# Altium footprint library BIOSCOPE-LIB.PcbLib: 33 footprints (part 2 of 3)
Each footprint in its own frame and in the unit in brackets; x right, y up, seen from the top. Pads: shape width x height; smd on the part's side, far side on the other; paste and mask are expansions set on the pad; w line width, h text height; cw(c..) or ccw(c..) is an arc to the next point about the centre after c.
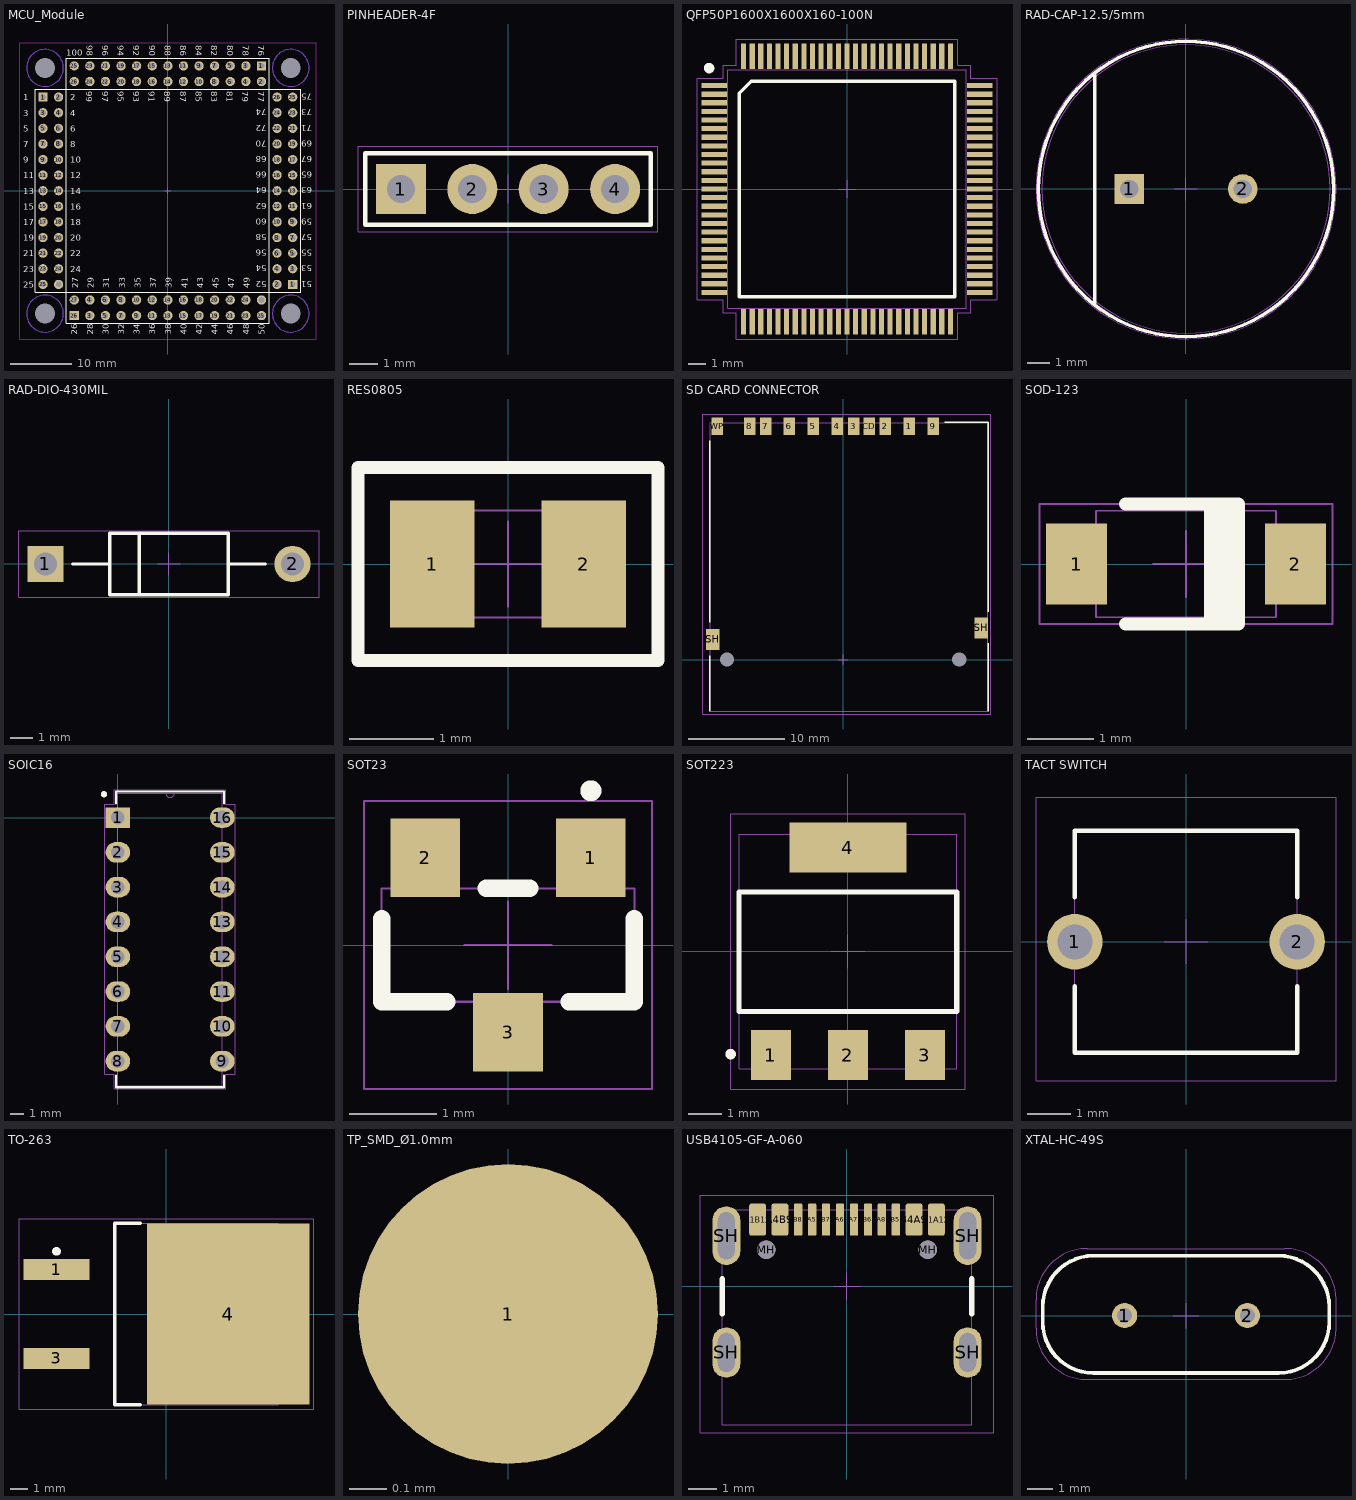
[diagram p1: the footprints below, top view; thin cyan lines are the x and y axes]

## MCU_Module [mm]
pads (108):
  round 0 hole 3.25: 0(-20,-20) 0(-20,20) 0(20,-20) 0(20,20)
  rect 1.5x1.5 hole 0.9: 1(-20.32,15.24) 1(15.24,20.32) 1(20.32,-15.24) 26(-15.24,-20.32)
  round 1.5 hole 0.9: 2(-17.78,15.24) 2(15.24,17.78) 2(17.78,-15.24) 3(-20.32,12.7) 3(-12.7,-20.32) 3(12.7,20.32) 3(20.32,-12.7) 4(-17.78,12.7) 4(-12.7,-17.78) 4(12.7,17.78) 4(17.78,-12.7) 5(-20.32,10.16) 5(-10.16,-20.32) 5(10.16,20.32) 5(20.32,-10.16) 6(-17.78,10.16) 6(-10.16,-17.78) 6(10.16,17.78) 6(17.78,-10.16) 7(-20.32,7.62) 7(-7.62,-20.32) 7(7.62,20.32) 7(20.32,-7.62) 8(-17.78,7.62) 8(-7.62,-17.78) 8(7.62,17.78) 8(17.78,-7.62) 9(-20.32,5.08) 9(-5.08,-20.32) 9(5.08,20.32) 9(20.32,-5.08) 10(-17.78,5.08) 10(-5.08,-17.78) 10(5.08,17.78) 10(17.78,-5.08) 11(-20.32,2.54) 11(-2.54,-20.32) 11(2.54,20.32) 11(20.32,-2.54) 12(-17.78,2.54) 12(-2.54,-17.78) 12(2.54,17.78) 12(17.78,-2.54) 13(-20.32,0) 13(0,-20.32) 13(0,20.32) 13(20.32,0) 14(-17.78,0) 14(0,-17.78) 14(0,17.78) 14(17.78,0) 15(-20.32,-2.54) 15(-2.54,20.32) 15(2.54,-20.32) 15(20.32,2.54) 16(-17.78,-2.54) 16(-2.54,17.78) 16(2.54,-17.78) 16(17.78,2.54) 17(-20.32,-5.08) 17(-5.08,20.32) 17(5.08,-20.32) 17(20.32,5.08) 18(-17.78,-5.08) 18(-5.08,17.78) 18(5.08,-17.78) 18(17.78,5.08) 19(-20.32,-7.62) 19(-7.62,20.32) 19(7.62,-20.32) 19(20.32,7.62) 20(-17.78,-7.62) 20(-7.62,17.78) 20(7.62,-17.78) 20(17.78,7.62) 21(-20.32,-10.16) 21(-10.16,20.32) 21(10.16,-20.32) 21(20.32,10.16) 22(-17.78,-10.16) 22(-10.16,17.78) 22(10.16,-17.78) 22(17.78,10.16) 23(-20.32,-12.7) 23(-12.7,20.32) 23(12.7,-20.32) 23(20.32,12.7) 24(-17.78,-12.7) 24(-12.7,17.78) 24(12.7,-17.78) 24(17.78,12.7) 25(-20.32,-15.24) 25(-15.24,20.32) 25(15.24,-20.32) 25(20.32,15.24) 26(-15.24,17.78) 26(17.78,15.24) 27(-15.24,-17.78) ""(-17.78,-15.24) ""(15.24,-17.78)
Bottom Layer keep-out:
  circle w0.15: c20,-20 r3
  circle w0.15: c20,20 r3
  circle w0.15: c-20,20 r3
  circle w0.15: c-20,-20 r3
Top Overlay:
  lines w0.2: -16.51,-16.51 -21.59,-16.51 -21.59,16.51 -16.51,16.51 ; -16.51,-16.51 -16.51,16.51 ; -16.51,-16.51 -16.51,-21.59 16.51,-21.59 16.51,-16.51 ; -16.51,-16.51 16.51,-16.51 ; -16.51,16.51 -16.51,21.59 16.51,21.59 16.51,16.51 ; -16.51,16.51 16.51,16.51 ; 16.51,-16.51 21.59,-16.51 21.59,16.51 16.51,16.51 ; 16.51,-16.51 16.51,16.51
  text "49" at 13.36,-15.9 h1
  text "47" at 10.82,-15.9 h1
  text "50" at 15.76,-23.4 h1
  text "48" at 13.22,-23.4 h1
  text "46" at 10.68,-23.4 h1
  text "45" at 8.28,-15.9 h1
  text "44" at 8.14,-23.4 h1
  text "43" at 5.74,-15.9 h1
  text "42" at 5.6,-23.4 h1
  text "41" at 3.2,-15.9 h1
  text "40" at 3.06,-23.4 h1
  text "39" at 0.66,-15.9 h1
  text "38" at 0.52,-23.4 h1
  text "37" at -1.88,-15.9 h1
  text "36" at -2.02,-23.4 h1
  text "35" at -4.42,-15.9 h1
  text "34" at -4.56,-23.4 h1
  text "33" at -6.96,-15.9 h1
  text "32" at -7.1,-23.4 h1
  text "31" at -9.5,-15.9 h1
  text "30" at -9.64,-23.4 h1
  text "28" at -12.18,-23.4 h1
  text "27" at -14.58,-15.9 h1
  text "1" at -23.5,14.7 h1
  text "25" at -23.5,-15.78 h1
  text "24" at -15.9,-13.24 h1
  text "23" at -23.5,-13.24 h1
  text "22" at -15.9,-10.7 h1
  text "21" at -23.5,-10.7 h1
  text "20" at -15.9,-8.16 h1
  text "19" at -23.5,-8.16 h1
  text "18" at -15.9,-5.62 h1
  text "17" at -23.5,-5.62 h1
  text "16" at -15.9,-3.08 h1
  text "15" at -23.5,-3.08 h1
  text "14" at -15.9,-0.54 h1
  text "13" at -23.5,-0.54 h1
  text "12" at -15.9,2 h1
  text "11" at -23.5,2 h1
  text "10" at -15.9,4.54 h1
  text "9" at -23.5,4.54 h1
  text "8" at -15.9,7.08 h1
  text "7" at -23.5,7.08 h1
  text "6" at -15.9,9.62 h1
  text "5" at -23.5,9.62 h1
  text "4" at -15.9,12.16 h1
  text "3" at -23.5,12.16 h1
  text "2" at -15.9,14.7 h1
  text "76" at 14.72,23.7 h1
  text "77" at 14.68,16.2 h1
  text "78" at 12.18,23.7 h1
  text "79" at 12.14,16.2 h1
  text "80" at 9.64,23.7 h1
  text "81" at 9.6,16.2 h1
  text "82" at 7.1,23.7 h1
  text "83" at 7.06,16.2 h1
  text "84" at 4.56,23.7 h1
  text "85" at 4.52,16.2 h1
  text "86" at 2.02,23.7 h1
  text "87" at 1.98,16.2 h1
  text "88" at -0.52,23.7 h1
  text "89" at -0.56,16.2 h1
  text "90" at -3.06,23.7 h1
  text "91" at -3.1,16.2 h1
  text "92" at -5.6,23.7 h1
  text "93" at -5.64,16.2 h1
  text "94" at -8.14,23.7 h1
  text "95" at -8.18,16.2 h1
  text "96" at -10.68,23.7 h1
  text "97" at -10.72,16.2 h1
  text "98" at -13.22,23.7 h1
  text "99" at -13.26,16.2 h1
  text "100" at -16.5,22 h1
  text "52" at 16.1,-14.7 h1
  text "53" at 23.5,-12.16 h1
  text "54" at 16.1,-12.16 h1
  text "55" at 23.5,-9.62 h1
  text "56" at 16.1,-9.62 h1
  text "57" at 23.5,-7.08 h1
  text "58" at 16.1,-7.08 h1
  text "59" at 23.5,-4.54 h1
  text "60" at 16.1,-4.54 h1
  text "61" at 23.5,-2 h1
  text "62" at 16.1,-2 h1
  text "63" at 23.5,0.54 h1
  text "64" at 16.1,0.54 h1
  text "65" at 23.5,3.08 h1
  text "66" at 16.1,3.08 h1
  text "67" at 23.5,5.62 h1
  text "68" at 16.1,5.62 h1
  text "69" at 23.5,8.16 h1
  text "70" at 16.1,8.16 h1
  text "71" at 23.5,10.7 h1
  text "72" at 16.1,10.7 h1
  text "73" at 23.5,13.24 h1
  text "74" at 16.1,13.24 h1
  text "75" at 23.5,15.78 h1
  text "51" at 23.5,-14.7 h1
  text "29" at -12.04,-15.9 h1
  text "26" at -14.72,-23.4 h1
Bottom Overlay:
  lines w0.15: -7.6,-5.43 -7.2,-5.43 ; -7.6,-4.63 -7.2,-4.63 ; -7.6,-3.83 -7.2,-3.83 ; -7.6,-3.03 -7.2,-3.03 ; -7.6,-0.83 -7.2,-0.83 ; -7.6,-0.03 -7.2,-0.03 ; -7.6,0.77 -7.2,0.77 ; -7.6,1.57 -7.2,1.57 ; -7.6,2.87 -7.2,2.87 ; -7.6,3.67 -7.2,3.67 ; -5.7,-7.63 -5.7,-7.23 ; -4.9,-7.63 -4.9,-7.23 ; -4.1,-7.63 -4.1,-7.23 ; -3.3,-7.63 -3.3,-7.23 ; -0.9,7.17 -0.9,7.57 ; -0.1,7.17 -0.1,7.57 ; 0.4,-7.73 0.4,-7.33 ; 1.2,-7.73 1.2,-7.33 ; 4.5,-5.9 4.9,-5.9 ; 4.5,-5.1 4.9,-5.1 ; 7.1,-0.93 7.5,-0.93 ; 7.1,-0.13 7.5,-0.13 ; 7.1,6.17 7.5,6.17 ; 7.1,6.97 7.5,6.97
Keep-Out Layer:
  lines w0.2: -24.13,-24.13 -24.13,24.13 24.13,24.13 24.13,-24.13 -24.13,-24.13
Top Designator:
  text ".Designator" at -4.579,-0.46 h2.03
Top Assembly (Mech15):
  lines w0.025: -0.5,0 0.5,0 ; 0,-0.5 0,0.5

## PINHEADER-4F [mil]
pads (4):
  rect 70x70 hole 39.37: 1(-150,0)
  round 70 hole 39.37: 2(-50,0) 3(50,0) 4(150,0)
Top Overlay:
  lines w6: -200,-50 200,-50 200,50 -200,50 -200,-50
Top Courtyard:
  lines w1: -210,-60 210,-60 210,60 -210,60 -210,-60
Top Designator:
  text ".Designator" at -88.67,-8.9 h39.37
Top Assembly (Mech15):
  lines w1: -19.68,0 19.68,0 ; 0,-19.69 0,19.68 ; -200,-50 -200,50 200,50 200,-50 -200,-50
3D body "PPPC041LFBN-RC.STEP": height 335, standoff -126, extent -210,-50 210,50

## QFP50P1600X1600X160-100N [mm] "QFP,0.50mm pitch,square;100 pin,14.00mm L X 14.00mm W X 1.60mm H body"
height 1.6
pads (100):
  rect 1.5x0.3 smd mask+0.048: 1(-7.7,6) 2(-7.7,5.5) 3(-7.7,5) 4(-7.7,4.5) 5(-7.7,4) 6(-7.7,3.5) 7(-7.7,3) 8(-7.7,2.5) 9(-7.7,2) 10(-7.7,1.5) 11(-7.7,1) 12(-7.7,0.5) 13(-7.7,0) 14(-7.7,-0.5) 15(-7.7,-1) 16(-7.7,-1.5) 17(-7.7,-2) 18(-7.7,-2.5) 19(-7.7,-3) 20(-7.7,-3.5) 21(-7.7,-4) 22(-7.7,-4.5) 23(-7.7,-5) 24(-7.7,-5.5) 25(-7.7,-6) 51(7.7,-6) 52(7.7,-5.5) 53(7.7,-5) 54(7.7,-4.5) 55(7.7,-4) 56(7.7,-3.5) 57(7.7,-3) 58(7.7,-2.5) 59(7.7,-2) 60(7.7,-1.5) 61(7.7,-1) 62(7.7,-0.5) 63(7.7,0) 64(7.7,0.5) 65(7.7,1) 66(7.7,1.5) 67(7.7,2) 68(7.7,2.5) 69(7.7,3) 70(7.7,3.5) 71(7.7,4) 72(7.7,4.5) 73(7.7,5) 74(7.7,5.5) 75(7.7,6)
  rect 0.3x1.5 smd mask+0.048: 26(-6,-7.7) 27(-5.5,-7.7) 28(-5,-7.7) 29(-4.5,-7.7) 30(-4,-7.7) 31(-3.5,-7.7) 32(-3,-7.7) 33(-2.5,-7.7) 34(-2,-7.7) 35(-1.5,-7.7) 36(-1,-7.7) 37(-0.5,-7.7) 38(0,-7.7) 39(0.5,-7.7) 40(1,-7.7) 41(1.5,-7.7) 42(2,-7.7) 43(2.5,-7.7) 44(3,-7.7) 45(3.5,-7.7) 46(4,-7.7) 47(4.5,-7.7) 48(5,-7.7) 49(5.5,-7.7) 50(6,-7.7) 76(6,7.7) 77(5.5,7.7) 78(5,7.7) 79(4.5,7.7) 80(4,7.7) 81(3.5,7.7) 82(3,7.7) 83(2.5,7.7) 84(2,7.7) 85(1.5,7.7) 86(1,7.7) 87(0.5,7.7) 88(0,7.7) 89(-0.5,7.7) 90(-1,7.7) 91(-1.5,7.7) 92(-2,7.7) 93(-2.5,7.7) 94(-3,7.7) 95(-3.5,7.7) 96(-4,7.7) 97(-4.5,7.7) 98(-5,7.7) 99(-5.5,7.7) 100(-6,7.7)
Top Overlay:
  circle w0.406: c-8.001,7.01 r0.1
  lines w0.2: -6.25,-6.25 6.25,-6.25 6.25,6.25 -5.561,6.25 -6.25,5.561 -6.25,-6.25
Top Courtyard:
  lines w0.025: -8.7,-6.413 -8.7,6.413 -7.175,6.413 -7.175,7.175 -6.413,7.175 -6.413,8.7 6.413,8.7 6.413,7.175 7.175,7.175 7.175,6.413 8.7,6.413 8.7,-6.413 7.175,-6.413 7.175,-7.175 6.413,-7.175 6.413,-8.7 -6.413,-8.7 -6.413,-7.175 -7.175,-7.175 -7.175,-6.413 -8.7,-6.413
Top Designator:
  text ".Designator" at -3.434,-0.345 h1.52
Top Assembly (Mech15):
  lines w0.025: -0.5,0 0.5,0 ; 0,-0.5 0,0.5 ; -6.921,-6.921 -6.921,6.921 6.921,6.921 6.921,-6.921 -6.921,-6.921
3D body "LQFP-100_14X14X1_7_NXP.step": height 1.7, standoff 0, extent -8,-8 8,8

## RAD-CAP-12.5/5mm [mm] "Radial CAP - 12.5mm Dia x 5mm spacing"
pads (2):
  rect 1.3x1.3 hole 0.8: 1(-2.5,0)
  round 1.3 hole 0.8: 2(2.5,0)
Top Overlay:
  circle w0.152: c0,0 r6.5
  lines w0.152: -4.025,-5.093 -4.025,5.097
Top Courtyard:
  circle w0.025: c0,0 r6.604
Top Designator:
  text ".Designator" at -3.434,-0.345 h1.52
Top Assembly (Mech15):
  lines w0.025: -0.5,0 0.5,0 ; 0,-0.5 0,0.5 ; -6.35,0 ccw(c0,0) 6.35,0 ccw(c0,0) -6.35,0
3D body "Cap_Panasonic_Electronic_Components_EEU-FC1V102_eec.STEP": height 0.25, standoff 0, extent -6.6,-6.6 6.6,6.6

## RAD-DIO-430MIL [mm]
pads (2):
  rect 1.6x1.6 hole 1: 1(-5.438,0)
  round 1.6 hole 1: 2(5.438,0)
Top Overlay:
  lines w0.152: -4.238,0 -2.6,0 ; -1.3,-1.29 -1.3,1.29 ; 2.6,0 4.238,0 ; -2.6,-1.36 -2.6,1.36 2.6,1.36 2.6,-1.36 -2.6,-1.36
Top Courtyard:
  lines w0.025: -6.604,-1.46 -6.604,1.46 6.604,1.46 6.604,-1.46 -6.604,-1.46
Top Designator:
  text ".Designator" at -2.252,-0.226 h1
Top Assembly (Mech15):
  lines w0.025: -0.5,0 0.5,0 ; 0,-0.5 0,0.5 ; -2.6,-1.36 2.6,-1.36 2.6,1.36 -2.6,1.36 -2.6,-1.36
3D body "Diode_onsemi_BZX85C3V9TR_eec.STEP": height 0.25, standoff 0, extent -6.338,-1.46 6.338,1.46

## RES0805 [mm] "Pasivo 0805"
height 0.7
pads (2):
  rect 1x1.5 smd: 1(-0.9,0) 2(0.9,0)
Top Overlay:
  lines w0.152: -1.778,-1.143 1.778,-1.143 1.778,1.143 -1.778,1.143 -1.778,-1.143
Top Courtyard:
  lines w0.025: -1.778,-1.143 -1.778,1.143 1.778,1.143 1.778,-1.143 -1.778,-1.143
Top Designator:
  text ".Designator" at -1.714,-0.172 h0.76
Top Assembly (Mech15):
  lines w0.025: -0.5,0 0.5,0 ; 0,-0.5 0,0.5 ; -1.016,-0.635 1.016,-0.635 1.016,0.635 -1.016,0.635 -1.016,-0.635
3D body "0805.STEP": height 0.39, standoff -0.02, extent -1,-0.625 1,0.625

## SD CARD CONNECTOR [mm] "693061010911"
pads (15):
  rect 1.2x1.8 smd: 1(6.88,24.3) 2(4.38,24.3) 3(1.08,24.3) 4(-0.63,24.3) 5(-3.13,24.3) 6(-5.63,24.3) 7(-8.05,24.3) 8(-9.75,24.3) 9(9.38,24.3) CD(2.73,24.3) WP(-13.1,24.3)
  rect 1.4x2.2 smd: SH(-13.6,2.1) SH(14.4,3.3)
  round 0 hole 1.5 paste+0 mask+0: ""(-12.1,0) ""(12.1,0)
Top Overlay:
  lines w0.152: -13.9,-5.4 -13.9,0.4 ; -13.9,3.9 -13.9,22.8 ; 10.6,24.7 15.1,24.7 15.1,23 15.1,5 ; 15.1,-5.4 15.1,1.7
Top Courtyard:
  lines w0.025: -14.624,-5.672 -14.624,1.186 -14.624,25.57 -14.116,25.57 15.348,25.57 15.348,-5.672 -14.624,-5.672
Top Designator:
  text ".Designator" at -4.579,-0.46 h2.03
Top Assembly (Mech15):
  lines w0.025: -0.5,0 0.5,0 ; 0,-0.5 0,0.5 ; -13.86,-5.4 15.04,-5.4 15.04,24.65 -13.86,24.65 -13.86,-5.4
3D body "693061010911_Download_STP_693061010911_rev1.stp": height 2.9, standoff -0.5, extent -13.86,-5.4 15.04,24.65

## SOD-123 [mil] "SOD-123, 2-Leads, Body 2.7x1.6mm, Height 1.35mm"
height 53.15
pads (2):
  rect 35.98x47.99 smd: 1(-64.5,0) 2(64.5,0)
Top Overlay:
  rectangle: 10.75,-35.43 30.75,35.43
  lines w7.87: -35.67,-35.43 30.75,-35.43 30.75,35.43 -35.67,35.43
Top Courtyard:
  lines w1: -86.42,-35.43 86.42,-35.43 86.42,35.43 -86.42,35.43 -86.42,-35.43
Top Designator:
  text ".Designator" at -88.67,-8.9 h39.37
Top Assembly (Mech15):
  lines w1: -19.69,0 19.68,0 ; 0,-19.68 0,19.68 ; -53.15,-31.5 -53.15,31.5 53.15,31.5 53.15,-31.5 -53.15,-31.5
3D body: height 53.15, standoff 0, extent -53.15,-31.5 53.15,31.5

## SOIC16 [mm]
pads (16):
  rect 1.8x1.5 hole 1: 1(0,0)
  oval 1.8x1.5 hole 1: 2(0,-2.54) 3(0,-5.08) 4(0,-7.62) 5(0,-10.16) 6(0,-12.7) 7(0,-15.24) 8(0,-17.78) 9(7.62,-17.78) 10(7.62,-15.24) 11(7.62,-12.7) 12(7.62,-10.16) 13(7.62,-7.62) 14(7.62,-5.08) 15(7.62,-2.54) 16(7.62,0)
Top Overlay:
  circle w0.254: c-1.016,1.702 r0.105
  lines w0.152: -0.127,-18.816 -0.127,-19.685 7.747,-19.685 7.747,-18.816 ; -0.127,1.044 -0.127,1.905 7.747,1.905 7.747,1.036
Mechanical 13:
  lines w0: 3.505,1.778 ccw(c3.81,1.778) 4.115,1.778
  lines w0.025: -0.457,-18.237 -0.457,-17.323 0,-17.323 0,-18.237 -0.457,-18.237 ; -0.457,-15.697 -0.457,-14.783 0,-14.783 0,-15.697 -0.457,-15.697 ; -0.457,-13.157 -0.457,-12.243 0,-12.243 0,-13.157 -0.457,-13.157 ; -0.457,-10.617 -0.457,-9.703 0,-9.703 0,-10.617 -0.457,-10.617 ; -0.457,-8.077 -0.457,-7.163 0,-7.163 0,-8.077 -0.457,-8.077 ; -0.457,-5.537 -0.457,-4.623 0,-4.623 0,-5.537 -0.457,-5.537 ; -0.457,-2.997 -0.457,-2.083 0,-2.083 0,-2.997 -0.457,-2.997 ; -0.457,-0.457 -0.457,0.457 0,0.457 0,-0.457 -0.457,-0.457 ; 0,-19.558 7.62,-19.558 7.62,1.778 0,1.778 0,-19.558 ; 7.62,-18.237 7.62,-17.323 8.077,-17.323 8.077,-18.237 7.62,-18.237 ; 7.62,-15.697 7.62,-14.783 8.077,-14.783 8.077,-15.697 7.62,-15.697 ; 7.62,-13.157 7.62,-12.243 8.077,-12.243 8.077,-13.157 7.62,-13.157 ; 7.62,-10.617 7.62,-9.703 8.077,-9.703 8.077,-10.617 7.62,-10.617 ; 7.62,-8.077 7.62,-7.163 8.077,-7.163 8.077,-8.077 7.62,-8.077 ; 7.62,-5.537 7.62,-4.623 8.077,-4.623 8.077,-5.537 7.62,-5.537 ; 7.62,-2.997 7.62,-2.083 8.077,-2.083 8.077,-2.997 7.62,-2.997 ; 7.62,-0.457 7.62,0.457 8.077,0.457 8.077,-0.457 7.62,-0.457
  text "*" at -0.064,-0.635 h1.27
Top Assembly (Mech15):
  lines w0.025: -0.965,-18.745 -0.965,0.965 -0.254,0.965 -0.254,2.032 7.874,2.032 7.874,0.965 8.585,0.965 8.585,-18.745 7.874,-18.745 7.874,-19.812 -0.254,-19.812 -0.254,-18.745 -0.965,-18.745
3D body "J16.step": height 2.21, standoff -5.54, extent -0.128,-19.558 7.863,1.778

## SOT23 [mm] "SOT23, 3-Leads, Body 1.3x2.9mm, Pitch 0.95mm"
height 1.1
pads (3):
  rect 0.8x0.9 smd paste-0.05: 1(0.95,1) 2(-0.95,1) 3(0,-1)
Top Overlay:
  circle w0.2: c0.95,1.77 r0.02
  lines w0.2: -1.45,0.304 -1.45,-0.65 -0.7,-0.65 ; -0.25,0.65 0.25,0.65 ; 0.7,-0.65 1.45,-0.65 1.45,0.304
Top Courtyard:
  lines w0.025: -1.651,-1.651 -1.651,1.651 1.651,1.651 1.651,-1.651 -1.651,-1.651
Top Designator:
  text ".Designator" at -1.714,-0.172 h0.76
Top Assembly (Mech15):
  lines w0.025: -0.5,0 0.5,0 ; 0,-0.5 0,0.5 ; -1.45,-0.65 -1.45,0.65 1.45,0.65 1.45,-0.65 -1.45,-0.65
3D body: height 1.1, standoff 0, extent -1.45,-0.65 1.45,0.65

## SOT223 [mm] "SOT223"
height 1.1
pads (4):
  rect 1.2x1.5 smd paste-0.05: 1(-2.3,-3.1) 2(0,-3.1) 3(2.3,-3.1)
  rect 3.5x1.5 smd paste-0.05: 4(0,3.1)
Top Overlay:
  circle w0.2: c-3.505,-3.073 r0.057
  lines w0.152: -3.25,-1.803 3.251,-1.803 3.251,1.778 -3.25,1.778 -3.25,-1.803
Top Courtyard:
  lines w0.025: -3.505,-4.115 3.505,-4.115 3.505,4.115 -3.505,4.115 -3.505,-4.115
Top Designator:
  text ".Designator" at -1.714,-0.172 h0.76
Top Assembly (Mech15):
  lines w0.025: -0.5,0 0.5,0 ; 0,-0.5 0,0.5 ; -3.251,-3.505 3.251,-3.505 3.251,3.505 -3.251,3.505 -3.251,-3.505
3D body "DCY0004A.stp": height 1.68, standoff 0, extent -3.25,-3.5 3.25,3.5

## TACT SWITCH [mm] "2 pin pushbutton/tactile switch"
pads (2):
  round 1.27 hole 0.8: 1(-2.54,0) 2(2.54,0)
Top Overlay:
  lines w0.102: -2.54,-1.016 -2.54,-2.54 2.54,-2.54 2.54,-1.016 ; -2.54,1.016 -2.54,2.54 2.54,2.54 2.54,1.016
Top Courtyard:
  lines w0.025: -3.429,-3.175 -3.429,3.302 3.429,3.302 3.429,-3.175 -3.429,-3.175
Top Designator:
  text ".Designator" at -1.714,-0.172 h0.76
Top Assembly (Mech15):
  lines w0.025: -0.5,0 0.5,0 ; 0,-0.5 0,0.5 ; -2.54,-2.54 2.54,-2.54 2.54,2.54 -2.54,2.54 -2.54,-2.54
3D body "B3F-6000 - short leads.step": height 4.3, standoff -3, extent -3,-3 3,3.2

## TO-263 [mm] "D2-PAK, 4-Leads, Body 9.2x10.2mm, Pitch 2.54mm, Lead Span 15.4mm, IPC Medium Density"
height 4.6
pads (3):
  rect 3.8x1.2 smd: 1(-6.3,2.54) 3(-6.3,-2.54)
  rect 9.3x10.4 smd: 4(3.55,0)
Top Overlay:
  circle w0.25: c-6.3,3.59 r0.125
  lines w0.2: -1.5,-5.2 -2.95,-5.2 -2.95,5.2 -1.5,5.2
Top Courtyard:
  lines w0.025: -8.45,-5.45 8.45,-5.45 8.45,5.45 -8.45,5.45 -8.45,-5.45
Top Designator:
  text ".Designator" at -0.345,3.434 h1.52
Top Assembly (Mech15):
  lines w0.025: -0.5,0 0.5,0 ; 0,-0.5 0,0.5 ; -2.95,-5.2 -2.95,5.2 6.4,5.2 6.4,-5.2 -2.95,-5.2
3D body "LM317D2TG.step": height 4.57, standoff 0, extent -7.099,-5.01 7.099,5.01

## TP_SMD_Ø1.0mm [mm]
height 0.6
pads (1):
  round 0.8 smd paste-1: 1(0,0)

## USB4105-GF-A-060 [mm]
pads (18):
  rrect25% 0.6x1.15 smd mask+0.048: A1B12(-3.2,2.378) A4B9(-2.4,2.378) B1A12(3.2,2.378) B4A9(2.4,2.378)
  rrect25% 0.3x1.15 smd mask+0.048: A5(-1.25,2.378) A6(-0.25,2.378) A7(0.25,2.378) A8(1.25,2.378) B5(1.75,2.378) B6(0.75,2.378) B7(-0.75,2.378) B8(-1.75,2.378)
  round 0.65 hole 0.65 unplated mask+0.025: MH(-2.89,1.303) MH(2.89,1.303)
  oval 1x1.8 hole 0.6 slot 1.4 at 90 deg: SH(-4.32,-2.377) SH(4.32,-2.377)
  oval 1x2.1 hole 0.6 slot 1.7 at 90 deg: SH(-4.32,1.803) SH(4.32,1.803)
Top Overlay:
  lines w0.2: -4.47,-0.996 -4.47,0.254 ; 4.47,-0.996 4.47,0.254
Top Courtyard:
  lines w0.025: -5.25,-5.25 5.25,-5.25 5.25,3.25 -5.25,3.25 -5.25,-3 -5.25,-5.25
Top Designator:
  text ".Designator" at -3.434,-0.345 h1.52
Top Assembly (Mech15):
  lines w0.025: -0.5,0 0.5,0 ; 0,-0.5 0,0.5 ; -4.47,-4.972 -4.47,2.728 4.47,2.728 4.47,-4.972 -4.47,-4.972
3D body "USB4105-GF-A-060.stp": height 3.27, standoff -0.61, extent -4.47,-4.972 4.47,2.728

## XTAL-HC-49S [mm] "Crystal HC-49S"
pads (2):
  round 1 hole 0.6: 1(-2.44,0) 2(2.44,0)
Top Overlay:
  lines w0.152: -5.699,-0.27 ccw(c-3.683,-0.27) -3.683,-2.286 3.683,-2.286 ccw(c3.683,-0.27) 5.699,-0.27 5.699,0.365 ccw(c3.683,0.365) 3.683,2.381 -3.683,2.381 ccw(c-3.683,0.365) -5.699,0.365 cw(c-5.699,0.365) -5.699,0.365 -5.699,-0.27
Top Courtyard:
  lines w0.025: -3.937,2.667 ccw(c-3.937,0.635) -5.969,0.635 -5.969,-0.508 ccw(c-3.937,-0.508) -3.937,-2.54 3.937,-2.54 ccw(c3.937,-0.508) 5.969,-0.508 5.969,0.635 ccw(c3.937,0.635) 3.937,2.667 -3.921,2.667
Top Designator:
  text ".Designator" at -3.434,-0.345 h1.52
Top Assembly (Mech15):
  lines w0.025: -0.5,0 0.5,0 ; 0,-0.5 0,0.5 ; -5.699,-0.27 ccw(c-3.683,-0.27) -3.683,-2.286 3.683,-2.286 ccw(c3.683,-0.27) 5.699,-0.27 5.699,0.365 ccw(c3.683,0.365) 3.683,2.381 -3.683,2.381 ccw(c-3.683,0.365) -5.699,0.365 cw(c-5.699,0.365) -5.699,0.365 -5.699,-0.27
3D body "User Library-HP49US.step": height 3.5, standoff -4, extent -5.675,-2.286 5.675,2.364